# Altium footprint library EMDC_Packages.PcbLib: 274 footprints (part 18 of 18)
Each footprint in its own frame and in the unit in brackets; x right, y up, seen from the top. Pads: shape width x height; smd on the part's side, far side on the other; paste and mask are expansions set on the pad; w line width, h text height; cw(c..) or ccw(c..) is an arc to the next point about the centre after c.
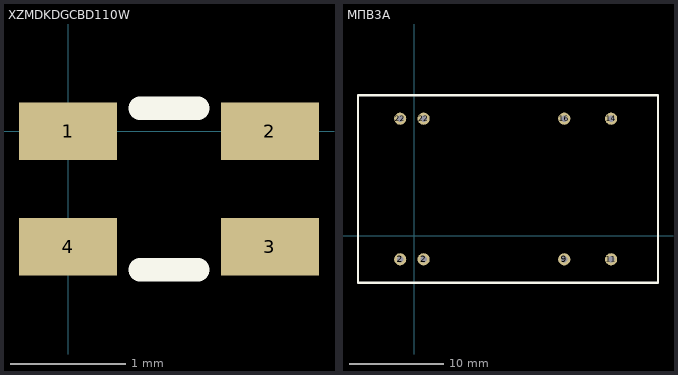
[diagram p17: the footprints below, top view; thin cyan lines are the x and y axes]

## XZMDKDGCBD110W [mm] "RGB LED SunLED XZMDKDGCBD110W"
pads (4):
  rect 0.85x0.5 smd: 1(0,0) 2(1.75,0) 3(1.75,-1) 4(0,-1)
Top Overlay:
  lines w0.2: 0.625,-1.2 1.125,-1.2 ; 0.625,0.2 1.125,0.2

## МПВ3А [mm]
pads (8):
  round 1.3 hole 0.7: 2(-1.5,-2.5) 2(1,-2.5) 9(16,-2.5) 11(21,-2.5) 14(21,12.5) 16(16,12.5) 22(-1.5,12.5) 22(1,12.5)
Top Overlay:
  lines w0.254: -6,-5 -6,15 26,15 26,-5 -6,-5